# Altium footprint library ElectrolytCapacitors.PcbLib: 25 footprints (part 1 of 2)
Each footprint in its own frame and in the unit in brackets; x right, y up, seen from the top. Pads: shape width x height; smd on the part's side, far side on the other; paste and mask are expansions set on the pad; w line width, h text height; cw(c..) or ccw(c..) is an arc to the next point about the centre after c.
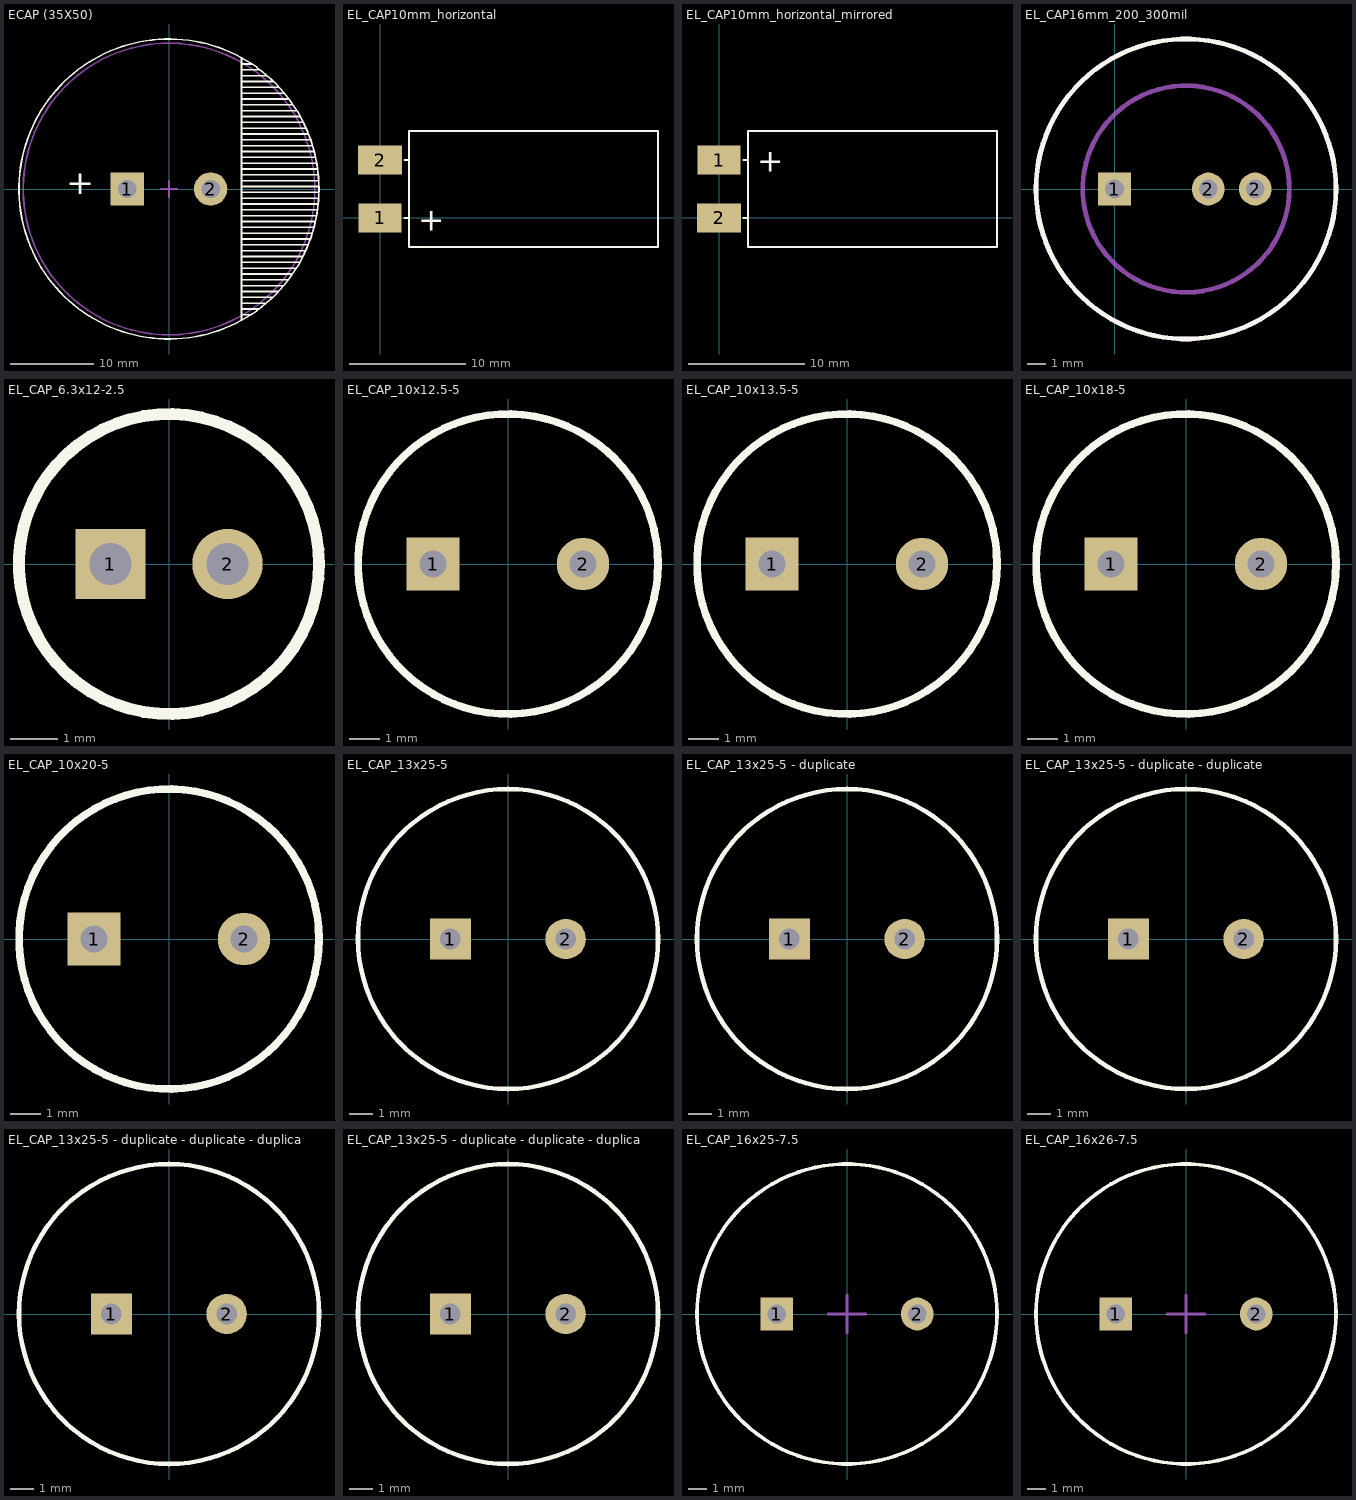
[diagram p0: the footprints below, top view; thin cyan lines are the x and y axes]

## ECAP (35X50) [mm] "ECAP (35X50)"
height 60.1
pads (2):
  rect 4x4 hole 2.2: 1(-5,0)
  round 4 hole 2.2: 2(5,0)
Top Overlay:
  circle w0.2: c0,0 r18
  lines w0.2: 8.7,-15.7 8.7,15.7 ; 8.7,-15.1 9.8,-15.1 ; 8.7,-14.4 10.8,-14.4 ; 8.7,-13.7 11.6,-13.7 ; 8.7,-13 12.4,-13 ; 8.7,-12.3 13.1,-12.3 ; 8.7,-11.6 13.7,-11.6 ; 8.7,-10.9 14.3,-10.9 ; 8.7,-10.2 14.8,-10.2 ; 8.7,-9.5 15.2,-9.5 ; 8.7,-8.8 15.6,-8.8 ; 8.7,-8.1 16,-8.1 ; 8.7,-7.4 16.4,-7.4 ; 8.7,-6.7 16.7,-6.7 ; 8.7,-6 16.9,-6 ; 8.7,-5.3 17.1,-5.3 ; 8.7,-4.6 17.4,-4.6 ; 8.7,-3.9 17.5,-3.9 ; 8.7,-3.2 17.7,-3.2 ; 8.7,-2.5 17.8,-2.5 ; 8.7,-1.8 17.9,-1.8 ; 8.7,-1.1 17.9,-1.1 ; 8.7,-0.4 17.9,-0.4 ; 8.7,0.3 17.9,0.3 ; 8.7,1 17.9,1 ; 8.7,1.7 17.9,1.7 ; 8.7,2.4 17.8,2.4 ; 8.7,3.1 17.7,3.1 ; 8.7,3.8 17.5,3.8 ; 8.7,4.5 17.4,4.5 ; 8.7,5.2 17.2,5.2 ; 8.7,5.9 17,5.9 ; 8.7,6.6 16.7,6.6 ; 8.7,7.3 16.4,7.3 ; 8.7,8 16.1,8 ; 8.7,8.7 15.7,8.7 ; 8.7,9.4 15.3,9.4 ; 8.7,10.1 14.8,10.1 ; 8.7,10.8 14.3,10.8 ; 8.7,11.5 13.8,11.5 ; 8.7,12.2 13.2,12.2 ; 8.7,12.9 12.5,12.9 ; 8.7,13.6 11.7,13.6 ; 8.7,14.3 10.8,14.3 ; 8.7,15 9.9,15
  text "+" at -12.3,-1.563 h5
Mechanical 15:
  circle w0.2: c0,0 r17.5
  lines w0.2: -1,0 1,0 ; 0,-1 0,1
3D body "конденсатор.STEP": height 60.1, standoff -6.2, extent -17.5,-17.5 17.5,17.5

## EL_CAP10mm_horizontal [mm]
height 10
pads (2):
  rect 3.75x2.5 smd: 1(0,0)
  rect 3.8x2.5 smd: 2(0,5)
Top Overlay:
  lines w0.178: 2.1,0 2.5,0 ; 2.1,5 2.5,5 ; 2.5,-2.5 2.5,7.5 24,7.5 24,-2.5 2.5,-2.5
  text "+" at 3.3,-1.1 h2
3D body: height 9, standoff -0.96, extent 2.5,-2.59 23.5,7.39

## EL_CAP10mm_horizontal_mirrored [mm]
height 10
pads (2):
  rect 3.75x2.5 smd: 1(0,5)
  rect 3.8x2.5 smd: 2(0,0)
Top Overlay:
  lines w0.178: 2.1,0 2.5,0 ; 2.1,5 2.5,5 ; 2.5,-2.5 24,-2.5 24,7.5 2.5,7.5 2.5,-2.5
  text "+" at 3.3,4 h2
3D body: height 9, standoff -0.96, extent 2.5,-2.59 23.5,7.39

## EL_CAP16mm_200_300mil [mm]
height 26.01
pads (3):
  rect 1.75x1.75 hole 1: 1(0,0)
  round 1.75 hole 1: 2(5,0) 2(7.5,0)
Top Overlay:
  circle w0.254: c3.81,0 r8.001
Mechanical 13:
  circle w0.254: c3.81,0 r8.001
  circle w0.254: c3.81,0 r5.512
3D body: height 25.98, standoff 0, extent -4.19,-8 11.81,8
3D body: height 26.01, standoff 0, extent -1.701,-5.511 9.321,5.511

## EL_CAP_6.3x12-2.5 [mm]
height 12
pads (2):
  rect 1.5x1.5 hole 0.9: 1(-1.25,0)
  round 1.5 hole 0.9: 2(1.25,0)
Top Overlay:
  circle w0.254: c0,0 r3.2
3D body "User Library-Cap-EL(6_3x12-2_5).step": height 12, standoff -3.2, extent -3.1,-3.15 3.202,3.15

## EL_CAP_10x12.5-5 [mm]
height 12.5
pads (2):
  rect 1.778x1.778 hole 0.9: 1(-2.5,0)
  round 1.75 hole 0.9: 2(2.5,0)
Top Overlay:
  circle w0.254: c0,0 r5
3D body "User Library-CE_R200_D400_H500.step": height 13.2, standoff -2.2, extent -5.08,-5.08 5.08,5.08

## EL_CAP_10x13.5-5 [mm]
height 13.5
pads (2):
  rect 1.778x1.778 hole 0.9: 1(-2.5,0)
  round 1.75 hole 0.9: 2(2.5,0)
Top Overlay:
  circle w0.254: c0,0 r5
3D body "User Library-Cap-EL(10x13_5-5)T.step": height 14.1, standoff -3.4, extent -5,-5 5.002,5

## EL_CAP_10x18-5 [mm]
height 18
pads (2):
  rect 1.778x1.778 hole 0.9: 1(-2.5,0)
  round 1.75 hole 0.9: 2(2.5,0)
Top Overlay:
  circle w0.254: c0,0 r5
3D body "User Library-CAPAER_D100_L180_P050_W006X030.STEP": height 18.11, standoff -2.9, extent -5,-5 5.01,5

## EL_CAP_10x20-5 [mm]
height 20
pads (2):
  rect 1.778x1.778 hole 0.9: 1(-2.5,0)
  round 1.75 hole 0.9: 2(2.5,0)
Top Overlay:
  circle w0.254: c0,0 r5
3D body "User Library-Cap-EL(10x20-5).step": height 20.1, standoff -3.2, extent -5,-5 5.002,5

## EL_CAP_13x25-5 [mm]
height 25
pads (2):
  rect 1.778x1.778 hole 0.9: 1(-2.5,0)
  round 1.75 hole 0.9: 2(2.5,0)
Top Overlay:
  circle w0.2: c0,0 r6.5
3D body "User Library-Cap-EL(13x25-5).step": height 25.25, standoff -3.05, extent -6.5,-6.5 6.502,6.5

## EL_CAP_13x25-5 - duplicate [mm]
height 25
pads (2):
  rect 1.778x1.778 hole 0.9: 1(-2.5,0)
  round 1.75 hole 0.9: 2(2.5,0)
Top Overlay:
  circle w0.2: c0,0 r6.5
3D body "User Library-Cap-EL(13x25-5).step": height 16.75, standoff 3.75, extent -19.707,2.012 4.037,33.157

## EL_CAP_13x25-5 - duplicate - duplicate [mm]
height 25
pads (2):
  rect 1.778x1.778 hole 0.9: 1(-2.5,0)
  round 1.75 hole 0.9: 2(2.5,0)
Top Overlay:
  circle w0.2: c0,0 r6.5
3D body "User Library-Cap-EL(13x25-5).step": height 16.75, standoff 3.75, extent -4.987,0.425 16.911,31.467

## EL_CAP_13x25-5 - duplicate - duplicate - duplicate [mm]
height 25
pads (2):
  rect 1.778x1.778 hole 0.9: 1(-2.5,0)
  round 1.75 hole 0.9: 2(2.5,0)
Top Overlay:
  circle w0.2: c0,0 r6.5
3D body "User Library-Cap-EL(13x25-5).step": height 16.75, standoff 3.75, extent -18.764,-31.825 4.98,-0.68

## EL_CAP_13x25-5 - duplicate - duplicate - duplicate - duplicate [mm]
height 25
pads (2):
  rect 1.778x1.778 hole 0.9: 1(-2.5,0)
  round 1.75 hole 0.9: 2(2.5,0)
Top Overlay:
  circle w0.2: c0,0 r6.5
3D body "User Library-Cap-EL(13x25-5).step": height 16.75, standoff 3.75, extent -4.764,-31.57 18.98,-0.425

## EL_CAP_16x25-7.5 [mm]
height 25
pads (2):
  rect 1.75x1.75 hole 1: 1(-3.75,0)
  round 1.75 hole 1: 2(3.75,0)
Top Overlay:
  circle w0.2: c0,0 r8
Mechanical 15:
  circle w0.15: c0,0 r8
  lines w0.15: -1,0 1,0 ; 0,-1 0,1
3D body "User Library-ElCap_16x25-7.5.step": height 26.4, standoff -2.5, extent -8.24,-8.25 8.26,8.25

## EL_CAP_16x26-7.5 [mm]
height 26
pads (2):
  rect 1.75x1.75 hole 1: 1(-3.75,0)
  round 1.75 hole 1: 2(3.75,0)
Top Overlay:
  circle w0.2: c0,0 r8
Mechanical 15:
  circle w0.15: c0,0 r8
  lines w0.15: -1,0 1,0 ; 0,-1 0,1
3D body "User Library-Cap-EL(16x26-7_5).step": height 26.5, standoff -3.8, extent -7.99,-7.997 8.012,7.997